# Altium integrated library Integrated_Library - 02.02.25 - 22.49.IntLib: 792 symbols (part 5 of 11) (continued)
## CMP-009-00095-2 (continued)
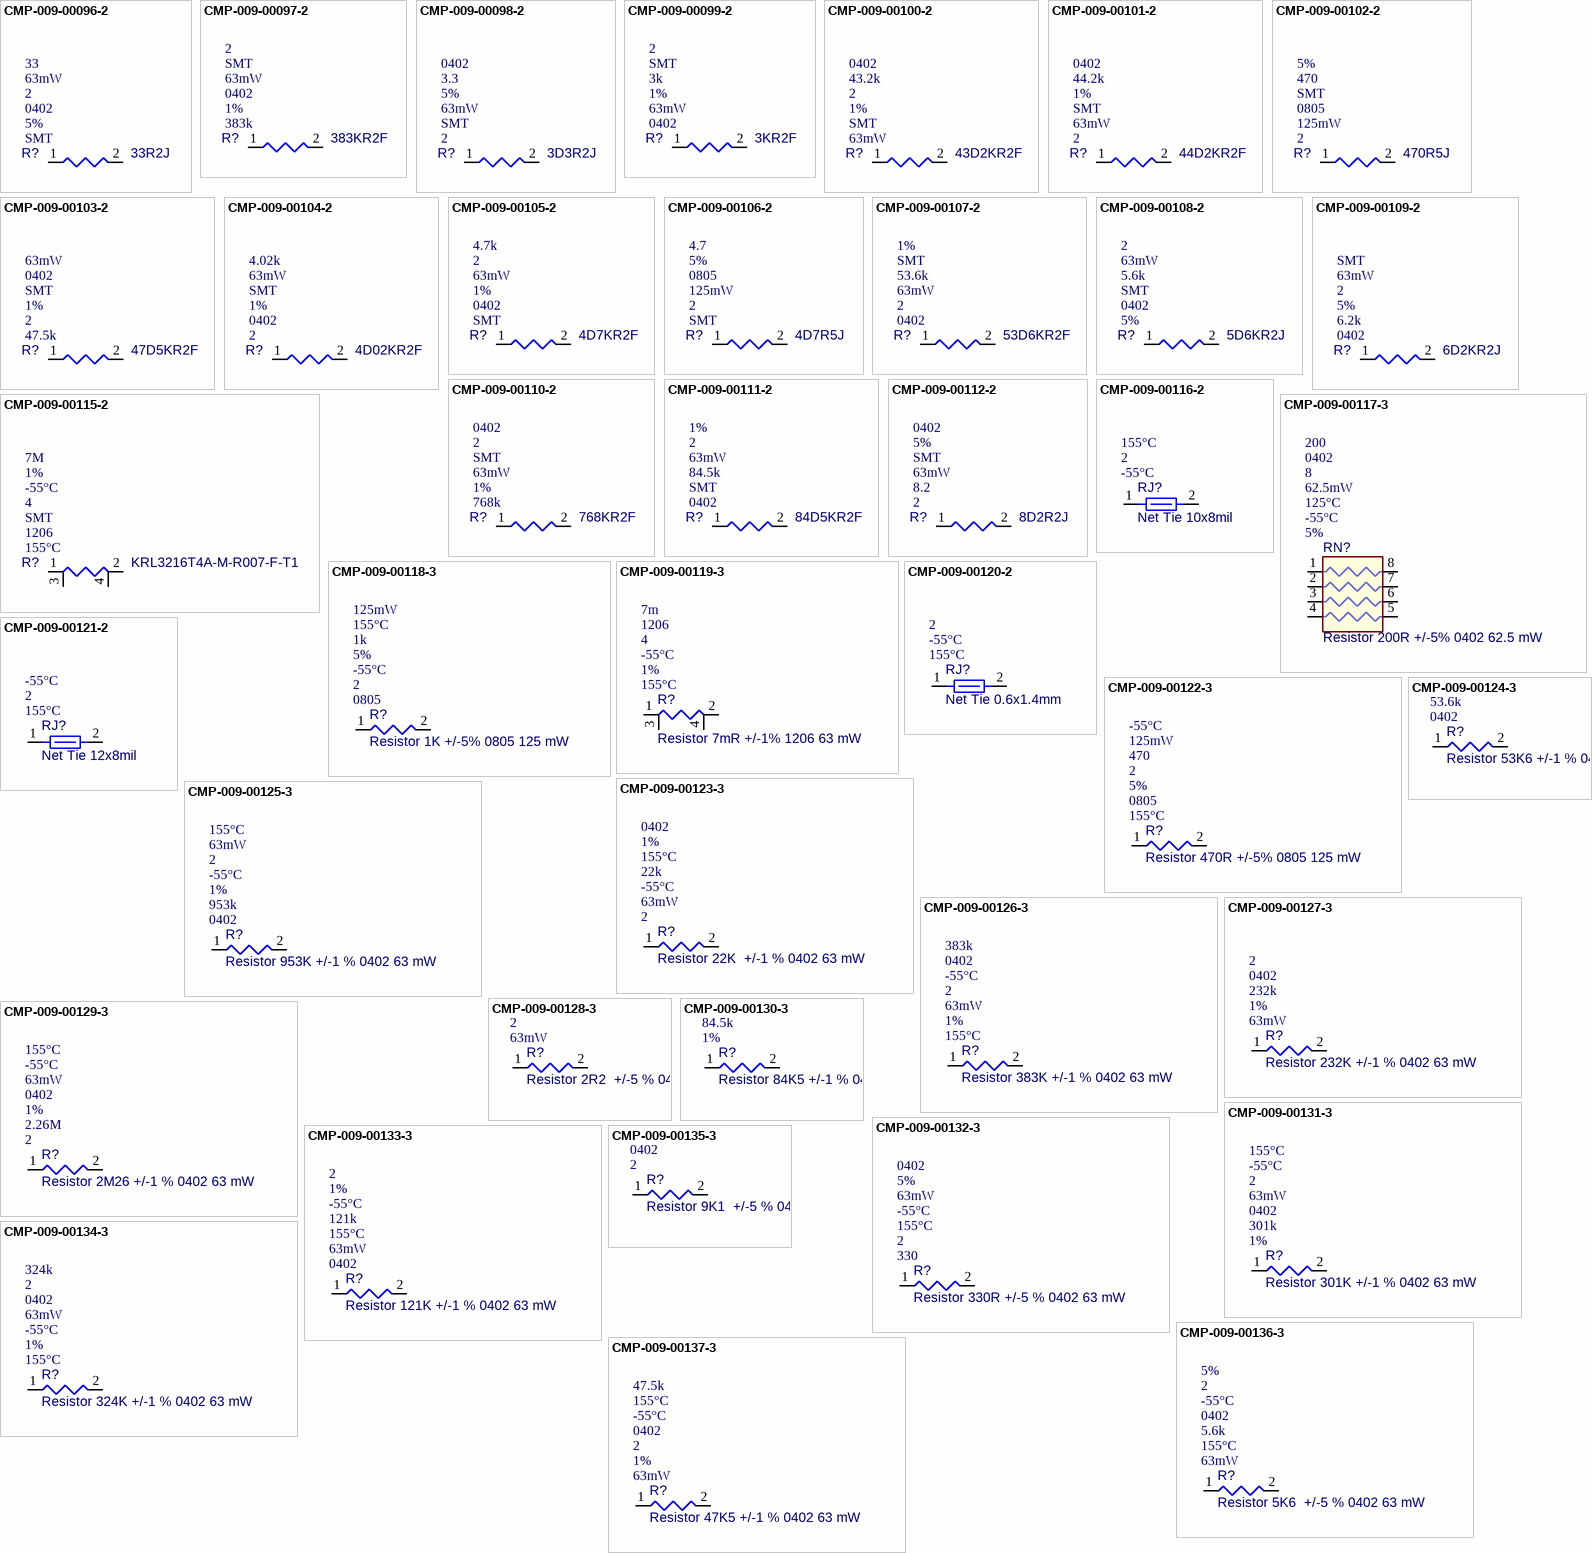
[diagram p12: symbols CMP-009-00096-2 to CMP-009-00137-3]

## CMP-009-00096-2
designator R?, comment 33R2J  value 33  Mounting Technology: SMT  Tolerance: 5%  Case/Package: 0402  Pins: 2  Power: 63mW
33R 0.063W 5% 0402 (1005 Metric)  SMD; Case-Metric: 1005; Value: 33.00 Ohm; Tolerance: 5 %; Technology: SMT; Case-EIA: 0402; Power: 0.063 W
footprint RESC0402(1005)_L (Chip Resistor, Body 1.0x0.5mm, IPC High Density)
footprint RESC0402(1005)_L-1 (Chip Resistor, Body 1.0x0.5mm, IPC High Density)
pins: 1, 2
1 alternate drawing of the same symbol

## CMP-009-00097-2
designator R?, comment 383KR2F  value 383k  Tolerance: 1%  Case/Package: 0402  Power: 63mW  Mounting Technology: SMT  Pins: 2
383K 0.063W 1% 0402 (1005 Metric)  SMD; Value: 383000.00 Ohm; Case-Metric: 1005; Case-EIA: 0402; Tolerance: 1 %; Power: 0.063 W; Technology: SMT
footprint RESC0402(1005)_L (Chip Resistor, Body 1.0x0.5mm, IPC High Density)
footprint RESC0402(1005)_L-1 (Chip Resistor, Body 1.0x0.5mm, IPC High Density)
pins: 1, 2
1 alternate drawing of the same symbol

## CMP-009-00098-2
designator R?, comment 3D3R2J  value 3.3  Pins: 2  Mounting Technology: SMT  Power: 63mW  Tolerance: 5%  Case/Package: 0402
3R3 0.063W 5% 0402 (1005 Metric)  SMD; Value: 3.30 Ohm; Case-Metric: 1005; Tolerance: 5 %; Technology: SMT; Power: 0.063 W; Case-EIA: 0402
footprint RESC0402(1005)_L (Chip Resistor, Body 1.0x0.5mm, IPC High Density)
footprint RESC0402(1005)_L-1 (Chip Resistor, Body 1.0x0.5mm, IPC High Density)
pins: 1, 2
1 alternate drawing of the same symbol

## CMP-009-00099-2
designator R?, comment 3KR2F  value 3k  Case/Package: 0402  Power: 63mW  Tolerance: 1%  Mounting Technology: SMT  Pins: 2
3K 0.063W 1% 0402 (1005 Metric)  SMD; Case-Metric: 1005; Value: 3000.00 Ohm; Technology: SMT; Case-EIA: 0402; Power: 0.063 W; Tolerance: 1 %
footprint RESC0402(1005)_L (Chip Resistor, Body 1.0x0.5mm, IPC High Density)
footprint RESC0402(1005)_L-1 (Chip Resistor, Body 1.0x0.5mm, IPC High Density)
pins: 1, 2
1 alternate drawing of the same symbol

## CMP-009-00100-2
designator R?, comment 43D2KR2F  value 43.2k  Power: 63mW  Mounting Technology: SMT  Tolerance: 1%  Pins: 2  Case/Package: 0402
43K2 0.063W 1% 0402 (1005 Metric)  SMD; Value: 43200.00 Ohm; Case-Metric: 1005; Tolerance: 1 %; Technology: SMT; Case-EIA: 0402; Power: 0.063 W
footprint RESC0402(1005)_L (Chip Resistor, Body 1.0x0.5mm, IPC High Density)
footprint RESC0402(1005)_L-1 (Chip Resistor, Body 1.0x0.5mm, IPC High Density)
pins: 1, 2
1 alternate drawing of the same symbol

## CMP-009-00101-2
designator R?, comment 44D2KR2F  value 44.2k  Pins: 2  Power: 63mW  Mounting Technology: SMT  Tolerance: 1%  Case/Package: 0402
44K2 0.063W 1% 0402 (1005 Metric)  SMD; Case-Metric: 1005; Value: 44200.00 Ohm; Technology: SMT; Tolerance: 1 %; Case-EIA: 0402; Power: 0.063 W
footprint RESC0402(1005)_L (Chip Resistor, Body 1.0x0.5mm, IPC High Density)
footprint RESC0402(1005)_L-1 (Chip Resistor, Body 1.0x0.5mm, IPC High Density)
pins: 1, 2
1 alternate drawing of the same symbol

## CMP-009-00102-2
designator R?, comment 470R5J  value 470  Pins: 2  Power: 125mW  Case/Package: 0805  Mounting Technology: SMT  Tolerance: 5%
470R 0.125W 5% 0805 (2012 Metric)  SMD; Value: 470.00 Ohm; Case-Metric: 2012; Power: 0.125 W; Technology: SMT; Case-EIA: 0805
footprint RESC0805(2012)_L (Chip Resistor, Body 2.0x1.3mm, IPC High Density)
footprint RESC0805(2012)_L-13 (Chip Resistor, Body 2.0x1.3mm, IPC High Density)
pins: 1, 2
1 alternate drawing of the same symbol

## CMP-009-00103-2
designator R?, comment 47D5KR2F  value 47.5k  Pins: 2  Tolerance: 1%  Mounting Technology: SMT  Case/Package: 0402  Power: 63mW
47K5 0.063W 1% 0402 (1005 Metric)  SMD; Case-Metric: 1005; Value: 47500.00 Ohm; Power: 0.063 W; Case-EIA: 0402; Tolerance: 1 %; Technology: SMT
footprint RESC0402(1005)_L (Chip Resistor, Body 1.0x0.5mm, IPC High Density)
footprint RESC0402(1005)_L-1 (Chip Resistor, Body 1.0x0.5mm, IPC High Density)
pins: 1, 2
1 alternate drawing of the same symbol

## CMP-009-00104-2
designator R?, comment 4D02KR2F  value 4.02k  Pins: 2  Case/Package: 0402  Tolerance: 1%  Mounting Technology: SMT  Power: 63mW
4K02 0.063W 1% 0402 (1005 Metric)  SMD; Value: 4020.00 Ohm; Case-Metric: 1005; Power: 0.063 W; Tolerance: 1 %; Technology: SMT; Case-EIA: 0402
footprint RESC0402(1005)_L (Chip Resistor, Body 1.0x0.5mm, IPC High Density)
footprint RESC0402(1005)_L-1 (Chip Resistor, Body 1.0x0.5mm, IPC High Density)
pins: 1, 2
1 alternate drawing of the same symbol

## CMP-009-00105-2
designator R?, comment 4D7KR2F  value 4.7k  Mounting Technology: SMT  Case/Package: 0402  Tolerance: 1%  Power: 63mW  Pins: 2
4K7 0.063W 1% 0402 (1005 Metric)  SMD; Value: 4700.00 Ohm; Case-Metric: 1005; Technology: SMT; Tolerance: 1 %; Case-EIA: 0402; Power: 0.063 W
footprint RESC0402(1005)_L (Chip Resistor, Body 1.0x0.5mm, IPC High Density)
footprint RESC0402(1005)_L-1 (Chip Resistor, Body 1.0x0.5mm, IPC High Density)
pins: 1, 2
1 alternate drawing of the same symbol

## CMP-009-00106-2
designator R?, comment 4D7R5J  value 4.7  Mounting Technology: SMT  Pins: 2  Power: 125mW  Case/Package: 0805  Tolerance: 5%
4R7 0.125W 5% 0805 (2012 Metric)  SMD; Value: 4.70 Ohm; Case-Metric: 2012; Technology: SMT; Case-EIA: 0805; Power: 0.125 W; Tolerance: 5 %
footprint RESC0805(2012)_L (Chip Resistor, Body 2.0x1.3mm, IPC High Density)
footprint RESC0805(2012)_L-13 (Chip Resistor, Body 2.0x1.3mm, IPC High Density)
pins: 1, 2
1 alternate drawing of the same symbol

## CMP-009-00107-2
designator R?, comment 53D6KR2F  value 53.6k  Case/Package: 0402  Pins: 2  Power: 63mW  Mounting Technology: SMT  Tolerance: 1%
53K6 0.063W 1% 0402 (1005 Metric)  SMD; Case-Metric: 1005; Value: 53600.00 Ohm; Technology: SMT; Power: 0.063 W; Case-EIA: 0402; Tolerance: 1 %
footprint RESC0402(1005)_L (Chip Resistor, Body 1.0x0.5mm, IPC High Density)
footprint RESC0402(1005)_L-1 (Chip Resistor, Body 1.0x0.5mm, IPC High Density)
pins: 1, 2
1 alternate drawing of the same symbol

## CMP-009-00108-2
designator R?, comment 5D6KR2J  value 5.6k  Tolerance: 5%  Case/Package: 0402  Mounting Technology: SMT  Power: 63mW  Pins: 2
5K6 0.063W 5% 0402 (1005 Metric)  SMD; Case-Metric: 1005; Value: 5600.00 Ohm; Technology: SMT; Power: 0.063 W; Case-EIA: 0402; Tolerance: 5 %
footprint RESC0402(1005)_L (Chip Resistor, Body 1.0x0.5mm, IPC High Density)
footprint RESC0402(1005)_L-1 (Chip Resistor, Body 1.0x0.5mm, IPC High Density)
pins: 1, 2
1 alternate drawing of the same symbol

## CMP-009-00109-2
designator R?, comment 6D2KR2J  value 6.2k  Case/Package: 0402  Tolerance: 5%  Pins: 2  Power: 63mW  Mounting Technology: SMT
6K2 0.063W 5% 0402 (1005 Metric)  SMD; Case-Metric: 1005; Value: 6200.00 Ohm; Power: 0.063 W; Tolerance: 5 %; Case-EIA: 0402; Technology: SMT
footprint RESC0402(1005)_L (Chip Resistor, Body 1.0x0.5mm, IPC High Density)
footprint RESC0402(1005)_L-1 (Chip Resistor, Body 1.0x0.5mm, IPC High Density)
pins: 1, 2
1 alternate drawing of the same symbol

## CMP-009-00110-2
designator R?, comment 768KR2F  value 768k  Tolerance: 1%  Power: 63mW  Mounting Technology: SMT  Pins: 2  Case/Package: 0402
768K 0.063W 1% 0402 (1005 Metric)  SMD; Case-Metric: 1005; Value: 768000.00 Ohm; Case-EIA: 0402; Power: 0.063 W; Technology: SMT; Tolerance: 1 %
footprint RESC0402(1005)_L (Chip Resistor, Body 1.0x0.5mm, IPC High Density)
footprint RESC0402(1005)_L-1 (Chip Resistor, Body 1.0x0.5mm, IPC High Density)
pins: 1, 2
1 alternate drawing of the same symbol

## CMP-009-00111-2
designator R?, comment 84D5KR2F  value 84.5k  Case/Package: 0402  Mounting Technology: SMT  Power: 63mW  Pins: 2  Tolerance: 1%
84K5 0.063W 1% 0402 (1005 Metric)  SMD; Value: 84500.00 Ohm; Case-Metric: 1005; Technology: SMT; Tolerance: 1 %; Power: 0.063 W; Case-EIA: 0402
footprint RESC0402(1005)_L (Chip Resistor, Body 1.0x0.5mm, IPC High Density)
footprint RESC0402(1005)_L-1 (Chip Resistor, Body 1.0x0.5mm, IPC High Density)
pins: 1, 2
1 alternate drawing of the same symbol

## CMP-009-00112-2
designator R?, comment 8D2R2J  value 8.2  Pins: 2  Power: 63mW  Mounting Technology: SMT  Tolerance: 5%  Case/Package: 0402
8R2 0.063W 5% 0402 (1005 Metric)  SMD; Case-Metric: 1005; Value: 8.20 Ohm; Case-EIA: 0402; Tolerance: 5 %; Technology: SMT; Power: 0.063 W
footprint RESC0402(1005)_L (Chip Resistor, Body 1.0x0.5mm, IPC High Density)
footprint RESC0402(1005)_L-1 (Chip Resistor, Body 1.0x0.5mm, IPC High Density)
pins: 1, 2
1 alternate drawing of the same symbol

## CMP-009-00115-2
designator R?, comment KRL3216T4A-M-R007-F-T1  value 7M  Max Operating Temperature: 155°C  Case/Package: 1206  Mounting Technology: SMT  Pins: 4  Min Operating Temperature: -55°C  Tolerance: 1%
RES SMD 0.007 OHM 1W 1206 WIDE; Case-Metric: 3216; Value: 7000000.00 Ohm; Case-EIA: 1206; Technology: SMT
footprint SUSUMU-3216T4A (SMD, 4-Leads, Body 3.2x1.6mm)
footprint SUSUMU-3216T4A (SMD, 4-Leads, Body 3.2x1.6mm)
pins: 1 I1, 2 I2, 3 E1, 4 E2

## CMP-009-00116-2
designator RJ?, comment Net Tie 10x8mil  Min Operating Temperature: -55°C  Pins: 2  Max Operating Temperature: 155°C  (net tie, no BOM)
footprint New footprint 1
footprint New footprint 1
pins: 1, 2

## CMP-009-00117-3
designator RN?, comment Resistor 200R +/-5% 0402 62.5 mW  value 200  Tolerance: 5%  Min Operating Temperature: -55°C  Max Operating Temperature: 125°C  Power: 62.5mW  Pins: 8  Case/Package: 0402
Res Thick Film Array 200 Ohm 5% 200ppm/C ISOL Molded 8-Pin 0804(4 X 0402) Convex SMD Punched Carrier T/R
footprint Panasonic_EXB28 (Resistor network, 0402x4, convex terminal)
footprint Panasonic_EXB28-27 (Resistor network, 0402x4, convex terminal)
pins: 1, 2 1, 3 1, 4 1, 5 2, 6 2, 7 2, 8 2

## CMP-009-00118-3
designator R?, comment Resistor 1K +/-5% 0805 125 mW  value 1k  Case/Package: 0805  Pins: 2  Min Operating Temperature: -55°C  Tolerance: 5%  Max Operating Temperature: 155°C  Power: 125mW
Chip Resistor, 1 kOhms, +/-5%, 125 mW, -55 to 155 degC, 0805
footprint RESC0805(2012)_L (Chip Resistor, Body 2.0x1.3mm, IPC High Density)
footprint RESC0805(2012)_L-13 (Chip Resistor, Body 2.0x1.3mm, IPC High Density)
pins: 1, 2
1 alternate drawing of the same symbol

## CMP-009-00119-3
designator R?, comment Resistor 7mR +/-1% 1206 63 mW  value 7m  Max Operating Temperature: 155°C  Tolerance: 1%  Min Operating Temperature: -55°C  Pins: 4  Case/Package: 1206
Chip Resistor, 0,007 Ohms, +/-1%, 63 mW, -55 to 155 degC, 1206
footprint SUSUMU-3216T4A (SMD, 4-Leads, Body 3.2x1.6mm)
footprint SUSUMU-3216T4A-17 (SMD, 4-Leads, Body 3.2x1.6mm)
pins: 1 I1, 2 I2, 3 E1, 4 E2

## CMP-009-00120-2
designator RJ?, comment Net Tie 0.6x1.4mm  Max Operating Temperature: 155°C  Min Operating Temperature: -55°C  Pins: 2  (net tie, no BOM)
footprint New footprint 1
footprint SHORT10_8MIL-FP
pins: 1, 2

## CMP-009-00121-2
designator RJ?, comment Net Tie 12x8mil  Max Operating Temperature: 155°C  Pins: 2  Min Operating Temperature: -55°C  (net tie, no BOM)
footprint New footprint 1
footprint SHORT06-FP
pins: 1, 2

## CMP-009-00122-3
designator R?, comment Resistor 470R +/-5% 0805 125 mW  value 470  Max Operating Temperature: 155°C  Case/Package: 0805  Tolerance: 5%  Pins: 2  Power: 125mW  Min Operating Temperature: -55°C
Chip Resistor, 470 Ohms, +/-5%, 125 mW, -55 to 155 degC, 0805
footprint RESC0805(2012)_L (Chip Resistor, Body 2.0x1.3mm, IPC High Density)
footprint RESC0805(2012)_L-13 (Chip Resistor, Body 2.0x1.3mm, IPC High Density)
pins: 1, 2
1 alternate drawing of the same symbol

## CMP-009-00123-3
designator R?, comment Resistor 22K  +/-1 % 0402 63 mW  value 22k  Pins: 2  Power: 63mW  Min Operating Temperature: -55°C  Max Operating Temperature: 155°C  Tolerance: 1%  Case/Package: 0402
Chip Resistor, 22 kOhms, +/-1 %, 63 mW, -55 to 155 degC, 0402
footprint RESC0805(2012)_L (Chip Resistor, Body 2.0x1.3mm, IPC High Density)
footprint RESC0402(1005)_L-1 (Chip Resistor, Body 1.0x0.5mm, IPC High Density)
pins: 1, 2
1 alternate drawing of the same symbol

## CMP-009-00124-3
designator R?, comment Resistor 53K6 +/-1 % 0402 63 mW  value 53.6k  Case/Package: 0402  Min Operating Temperature: -55°C  Pins: 2  Power: 63mW  Tolerance: 1%  Max Operating Temperature: 155°C
Chip Resistor, 53,6 kOhms, +/-1 %, 63 mW, -55 to 155 degC, 0402
footprint RESC0805(2012)_L (Chip Resistor, Body 2.0x1.3mm, IPC High Density)
footprint RESC0402(1005)_L-1 (Chip Resistor, Body 1.0x0.5mm, IPC High Density)
pins: 1, 2
1 alternate drawing of the same symbol

## CMP-009-00125-3
designator R?, comment Resistor 953K +/-1 % 0402 63 mW  value 953k  Case/Package: 0402  Tolerance: 1%  Min Operating Temperature: -55°C  Pins: 2  Power: 63mW  Max Operating Temperature: 155°C
Chip Resistor, 953 kOhms, +/-1 %, 63 mW, -55 to 155 degC, 0402
footprint RESC0805(2012)_L (Chip Resistor, Body 2.0x1.3mm, IPC High Density)
footprint RESC0402(1005)_L-1 (Chip Resistor, Body 1.0x0.5mm, IPC High Density)
pins: 1, 2
1 alternate drawing of the same symbol

## CMP-009-00126-3
designator R?, comment Resistor 383K +/-1 % 0402 63 mW  value 383k  Max Operating Temperature: 155°C  Tolerance: 1%  Power: 63mW  Pins: 2  Min Operating Temperature: -55°C  Case/Package: 0402
Chip Resistor, 383 kOhms, +/-1 %, 63 mW, -55 to 155 degC, 0402
footprint RESC0805(2012)_L (Chip Resistor, Body 2.0x1.3mm, IPC High Density)
footprint RESC0402(1005)_L-1 (Chip Resistor, Body 1.0x0.5mm, IPC High Density)
pins: 1, 2
1 alternate drawing of the same symbol

## CMP-009-00127-3
designator R?, comment Resistor 232K +/-1 % 0402 63 mW  value 232k  Power: 63mW  Tolerance: 1%  Case/Package: 0402  Pins: 2
Chip Resistor, 232 kOhms, +/-1 %, 63 mW, -55 to 155 degC, 0402
footprint RESC0805(2012)_L (Chip Resistor, Body 2.0x1.3mm, IPC High Density)
footprint RESC0402(1005)_L-1 (Chip Resistor, Body 1.0x0.5mm, IPC High Density)
pins: 1, 2
1 alternate drawing of the same symbol

## CMP-009-00128-3
designator R?, comment Resistor 2R2  +/-5 % 0402 63 mW  value 2.2  Power: 63mW  Pins: 2  Case/Package: 0402  Min Operating Temperature: -55°C  Max Operating Temperature: 155°C  Tolerance: 5%
Chip Resistor, 2,2 Ohms, +/-5 %, 63 mW, -55 to 155 degC, 0402
footprint RESC0805(2012)_L (Chip Resistor, Body 2.0x1.3mm, IPC High Density)
footprint RESC0402(1005)_L-1 (Chip Resistor, Body 1.0x0.5mm, IPC High Density)
pins: 1, 2
1 alternate drawing of the same symbol

## CMP-009-00129-3
designator R?, comment Resistor 2M26 +/-1 % 0402 63 mW  value 2.26M  Pins: 2  Tolerance: 1%  Case/Package: 0402  Power: 63mW  Min Operating Temperature: -55°C  Max Operating Temperature: 155°C
Chip Resistor, 2,26 MOhms, +/-1 %, 63 mW, -55 to 155 degC, 0402
footprint RESC0805(2012)_L (Chip Resistor, Body 2.0x1.3mm, IPC High Density)
footprint RESC0402(1005)_L-1 (Chip Resistor, Body 1.0x0.5mm, IPC High Density)
pins: 1, 2
1 alternate drawing of the same symbol

## CMP-009-00130-3
designator R?, comment Resistor 84K5 +/-1 % 0402 63 mW  value 84.5k  Tolerance: 1%  Max Operating Temperature: 155°C  Min Operating Temperature: -55°C  Case/Package: 0402  Power: 63mW  Pins: 2
Chip Resistor, 84,5 kOhms, +/-1 %, 63 mW, -55 to 155 degC, 0402
footprint RESC0805(2012)_L (Chip Resistor, Body 2.0x1.3mm, IPC High Density)
footprint RESC0402(1005)_L-1 (Chip Resistor, Body 1.0x0.5mm, IPC High Density)
pins: 1, 2
1 alternate drawing of the same symbol

## CMP-009-00131-3
designator R?, comment Resistor 301K +/-1 % 0402 63 mW  value 301k  Tolerance: 1%  Case/Package: 0402  Power: 63mW  Pins: 2  Min Operating Temperature: -55°C  Max Operating Temperature: 155°C
Chip Resistor, 301 kOhms, +/-1 %, 63 mW, -55 to 155 degC, 0402
footprint RESC0805(2012)_L (Chip Resistor, Body 2.0x1.3mm, IPC High Density)
footprint RESC0402(1005)_L-1 (Chip Resistor, Body 1.0x0.5mm, IPC High Density)
pins: 1, 2
1 alternate drawing of the same symbol

## CMP-009-00132-3
designator R?, comment Resistor 330R +/-5 % 0402 63 mW  value 330  Pins: 2  Max Operating Temperature: 155°C  Min Operating Temperature: -55°C  Power: 63mW  Tolerance: 5%  Case/Package: 0402
Chip Resistor, 330 Ohms, +/-5 %, 63 mW, -55 to 155 degC, 0402
footprint RESC0805(2012)_L (Chip Resistor, Body 2.0x1.3mm, IPC High Density)
footprint RESC0402(1005)_L-1 (Chip Resistor, Body 1.0x0.5mm, IPC High Density)
pins: 1, 2
1 alternate drawing of the same symbol

## CMP-009-00133-3
designator R?, comment Resistor 121K +/-1 % 0402 63 mW  value 121k  Case/Package: 0402  Power: 63mW  Max Operating Temperature: 155°C  Min Operating Temperature: -55°C  Tolerance: 1%  Pins: 2
Chip Resistor, 121 kOhms, +/-1 %, 63 mW, -55 to 155 degC, 0402
footprint RESC0805(2012)_L (Chip Resistor, Body 2.0x1.3mm, IPC High Density)
footprint RESC0402(1005)_L-1 (Chip Resistor, Body 1.0x0.5mm, IPC High Density)
pins: 1, 2
1 alternate drawing of the same symbol

## CMP-009-00134-3
designator R?, comment Resistor 324K +/-1 % 0402 63 mW  value 324k  Max Operating Temperature: 155°C  Tolerance: 1%  Min Operating Temperature: -55°C  Power: 63mW  Case/Package: 0402  Pins: 2
Chip Resistor, 324 kOhms, +/-1 %, 63 mW, -55 to 155 degC, 0402
footprint RESC0805(2012)_L (Chip Resistor, Body 2.0x1.3mm, IPC High Density)
footprint RESC0402(1005)_L-1 (Chip Resistor, Body 1.0x0.5mm, IPC High Density)
pins: 1, 2
1 alternate drawing of the same symbol

## CMP-009-00135-3
designator R?, comment Resistor 9K1  +/-5 % 0402 63 mW  value 9.1k  Pins: 2  Case/Package: 0402  Power: 63mW  Max Operating Temperature: 155°C  Tolerance: 5%  Min Operating Temperature: -55°C
Chip Resistor, 9,1 kOhms, +/-5 %, 63 mW, -55 to 155 degC, 0402
footprint RESC0805(2012)_L (Chip Resistor, Body 2.0x1.3mm, IPC High Density)
footprint RESC0402(1005)_L-1 (Chip Resistor, Body 1.0x0.5mm, IPC High Density)
pins: 1, 2
1 alternate drawing of the same symbol

## CMP-009-00136-3
designator R?, comment Resistor 5K6  +/-5 % 0402 63 mW  value 5.6k  Power: 63mW  Max Operating Temperature: 155°C  Case/Package: 0402  Min Operating Temperature: -55°C  Pins: 2  Tolerance: 5%
Chip Resistor, 5,6 kOhms, +/-5 %, 63 mW, -55 to 155 degC, 0402
footprint RESC0805(2012)_L (Chip Resistor, Body 2.0x1.3mm, IPC High Density)
footprint RESC0402(1005)_L-1 (Chip Resistor, Body 1.0x0.5mm, IPC High Density)
pins: 1, 2
1 alternate drawing of the same symbol

## CMP-009-00137-3
designator R?, comment Resistor 47K5 +/-1 % 0402 63 mW  value 47.5k  Power: 63mW  Tolerance: 1%  Pins: 2  Case/Package: 0402  Min Operating Temperature: -55°C  Max Operating Temperature: 155°C
Chip Resistor, 47,5 kOhms, +/-1 %, 63 mW, -55 to 155 degC, 0402
footprint RESC0805(2012)_L (Chip Resistor, Body 2.0x1.3mm, IPC High Density)
footprint RESC0402(1005)_L-1 (Chip Resistor, Body 1.0x0.5mm, IPC High Density)
pins: 1, 2
1 alternate drawing of the same symbol

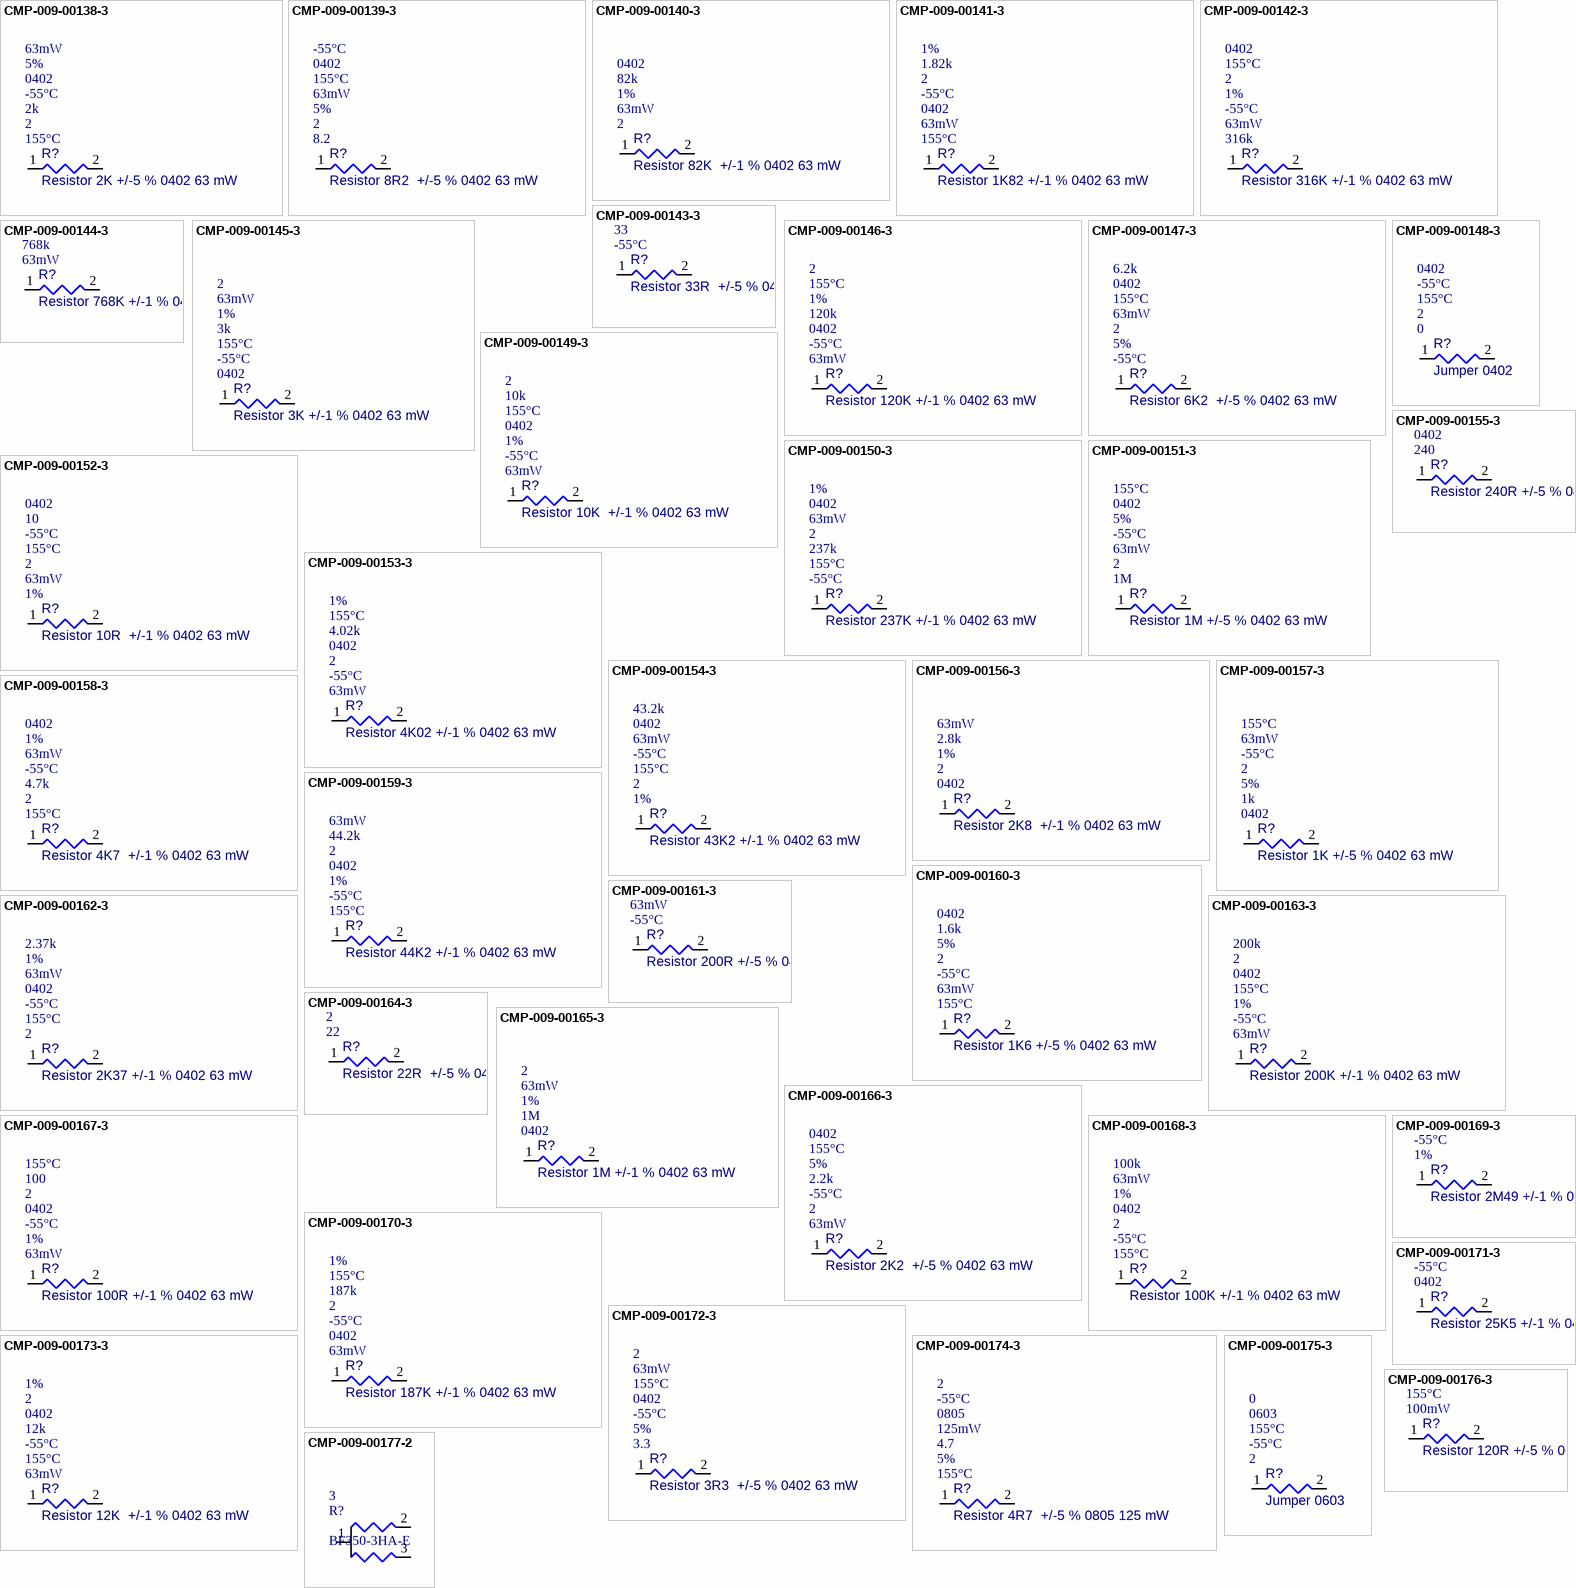
[diagram p13: symbols CMP-009-00138-3 to CMP-009-00177-2]

## CMP-009-00138-3
designator R?, comment Resistor 2K +/-5 % 0402 63 mW  value 2k  Max Operating Temperature: 155°C  Pins: 2  Min Operating Temperature: -55°C  Case/Package: 0402  Tolerance: 5%  Power: 63mW
Chip Resistor, 2 kOhms, +/-5 %, 63 mW, -55 to 155 degC, 0402
footprint RESC0805(2012)_L (Chip Resistor, Body 2.0x1.3mm, IPC High Density)
footprint RESC0402(1005)_L-1 (Chip Resistor, Body 1.0x0.5mm, IPC High Density)
pins: 1, 2
1 alternate drawing of the same symbol

## CMP-009-00139-3
designator R?, comment Resistor 8R2  +/-5 % 0402 63 mW  value 8.2  Pins: 2  Tolerance: 5%  Power: 63mW  Max Operating Temperature: 155°C  Case/Package: 0402  Min Operating Temperature: -55°C
Chip Resistor, 8,2 Ohms, +/-5 %, 63 mW, -55 to 155 degC, 0402
footprint RESC0805(2012)_L (Chip Resistor, Body 2.0x1.3mm, IPC High Density)
footprint RESC0402(1005)_L-1 (Chip Resistor, Body 1.0x0.5mm, IPC High Density)
pins: 1, 2
1 alternate drawing of the same symbol

## CMP-009-00140-3
designator R?, comment Resistor 82K  +/-1 % 0402 63 mW  value 82k  Pins: 2  Power: 63mW  Tolerance: 1%  Case/Package: 0402
Chip Resistor, 82 kOhms, +/-1 %, 63 mW, -55 to 155 degC, 0402
footprint RESC0805(2012)_L (Chip Resistor, Body 2.0x1.3mm, IPC High Density)
footprint RESC0402(1005)_L-1 (Chip Resistor, Body 1.0x0.5mm, IPC High Density)
pins: 1, 2
1 alternate drawing of the same symbol

## CMP-009-00141-3
designator R?, comment Resistor 1K82 +/-1 % 0402 63 mW  value 1.82k  Max Operating Temperature: 155°C  Power: 63mW  Case/Package: 0402  Min Operating Temperature: -55°C  Pins: 2  Tolerance: 1%
Chip Resistor, 1,82 kOhms, +/-1 %, 63 mW, -55 to 155 degC, 0402
footprint RESC0805(2012)_L (Chip Resistor, Body 2.0x1.3mm, IPC High Density)
footprint RESC0402(1005)_L-1 (Chip Resistor, Body 1.0x0.5mm, IPC High Density)
pins: 1, 2
1 alternate drawing of the same symbol

## CMP-009-00142-3
designator R?, comment Resistor 316K +/-1 % 0402 63 mW  value 316k  Power: 63mW  Min Operating Temperature: -55°C  Tolerance: 1%  Pins: 2  Max Operating Temperature: 155°C  Case/Package: 0402
Chip Resistor, 316 kOhms, +/-1 %, 63 mW, -55 to 155 degC, 0402
footprint RESC0805(2012)_L (Chip Resistor, Body 2.0x1.3mm, IPC High Density)
footprint RESC0402(1005)_L-1 (Chip Resistor, Body 1.0x0.5mm, IPC High Density)
pins: 1, 2
1 alternate drawing of the same symbol

## CMP-009-00143-3
designator R?, comment Resistor 33R  +/-5 % 0402 63 mW  value 33  Min Operating Temperature: -55°C  Tolerance: 5%  Case/Package: 0402  Power: 63mW  Max Operating Temperature: 155°C  Pins: 2
Chip Resistor, 33 Ohms, +/-5 %, 63 mW, -55 to 155 degC, 0402
footprint RESC0805(2012)_L (Chip Resistor, Body 2.0x1.3mm, IPC High Density)
footprint RESC0402(1005)_L-1 (Chip Resistor, Body 1.0x0.5mm, IPC High Density)
pins: 1, 2
1 alternate drawing of the same symbol

## CMP-009-00144-3
designator R?, comment Resistor 768K +/-1 % 0402 63 mW  value 768k  Power: 63mW  Tolerance: 1%  Max Operating Temperature: 155°C  Pins: 2  Min Operating Temperature: -55°C  Case/Package: 0402
Chip Resistor, 768 kOhms, +/-1 %, 63 mW, -55 to 155 degC, 0402
footprint RESC0805(2012)_L (Chip Resistor, Body 2.0x1.3mm, IPC High Density)
footprint RESC0402(1005)_L-1 (Chip Resistor, Body 1.0x0.5mm, IPC High Density)
pins: 1, 2
1 alternate drawing of the same symbol

## CMP-009-00145-3
designator R?, comment Resistor 3K +/-1 % 0402 63 mW  value 3k  Case/Package: 0402  Min Operating Temperature: -55°C  Max Operating Temperature: 155°C  Tolerance: 1%  Power: 63mW  Pins: 2
Chip Resistor, 3 kOhms, +/-1 %, 63 mW, -55 to 155 degC, 0402
footprint RESC0805(2012)_L (Chip Resistor, Body 2.0x1.3mm, IPC High Density)
footprint RESC0402(1005)_L-1 (Chip Resistor, Body 1.0x0.5mm, IPC High Density)
pins: 1, 2
1 alternate drawing of the same symbol

## CMP-009-00146-3
designator R?, comment Resistor 120K +/-1 % 0402 63 mW  value 120k  Power: 63mW  Min Operating Temperature: -55°C  Case/Package: 0402  Tolerance: 1%  Max Operating Temperature: 155°C  Pins: 2
Chip Resistor, 120 kOhms, +/-1 %, 63 mW, -55 to 155 degC, 0402
footprint RESC0805(2012)_L (Chip Resistor, Body 2.0x1.3mm, IPC High Density)
footprint RESC0402(1005)_L-1 (Chip Resistor, Body 1.0x0.5mm, IPC High Density)
pins: 1, 2
1 alternate drawing of the same symbol

## CMP-009-00147-3
designator R?, comment Resistor 6K2  +/-5 % 0402 63 mW  value 6.2k  Min Operating Temperature: -55°C  Tolerance: 5%  Pins: 2  Power: 63mW  Max Operating Temperature: 155°C  Case/Package: 0402
Chip Resistor, 6,2 kOhms, +/-5 %, 63 mW, -55 to 155 degC, 0402
footprint RESC0805(2012)_L (Chip Resistor, Body 2.0x1.3mm, IPC High Density)
footprint RESC0402(1005)_L-1 (Chip Resistor, Body 1.0x0.5mm, IPC High Density)
pins: 1, 2
1 alternate drawing of the same symbol

## CMP-009-00148-3
designator R?, comment Jumper 0402  value 0  Pins: 2  Max Operating Temperature: 155°C  Min Operating Temperature: -55°C  Case/Package: 0402
footprint RESC0805(2012)_L (Chip Resistor, Body 2.0x1.3mm, IPC High Density)
footprint RESC0402(1005)_L-1 (Chip Resistor, Body 1.0x0.5mm, IPC High Density)
pins: 1, 2
1 alternate drawing of the same symbol

## CMP-009-00149-3
designator R?, comment Resistor 10K  +/-1 % 0402 63 mW  value 10k  Power: 63mW  Min Operating Temperature: -55°C  Tolerance: 1%  Case/Package: 0402  Max Operating Temperature: 155°C  Pins: 2
Chip Resistor, 10 kOhms, +/-1 %, 63 mW, -55 to 125 degC, 0402
footprint RESC0805(2012)_L (Chip Resistor, Body 2.0x1.3mm, IPC High Density)
footprint RESC0402(1005)_L-1 (Chip Resistor, Body 1.0x0.5mm, IPC High Density)
pins: 1, 2
1 alternate drawing of the same symbol